# Altium footprint library E-Card.PcbLib: 26 footprints (part 2 of 2)
Each footprint in its own frame and in the unit in brackets; x right, y up, seen from the top. Pads: shape width x height; smd on the part's side, far side on the other; paste and mask are expansions set on the pad; w line width, h text height; cw(c..) or ccw(c..) is an arc to the next point about the centre after c.
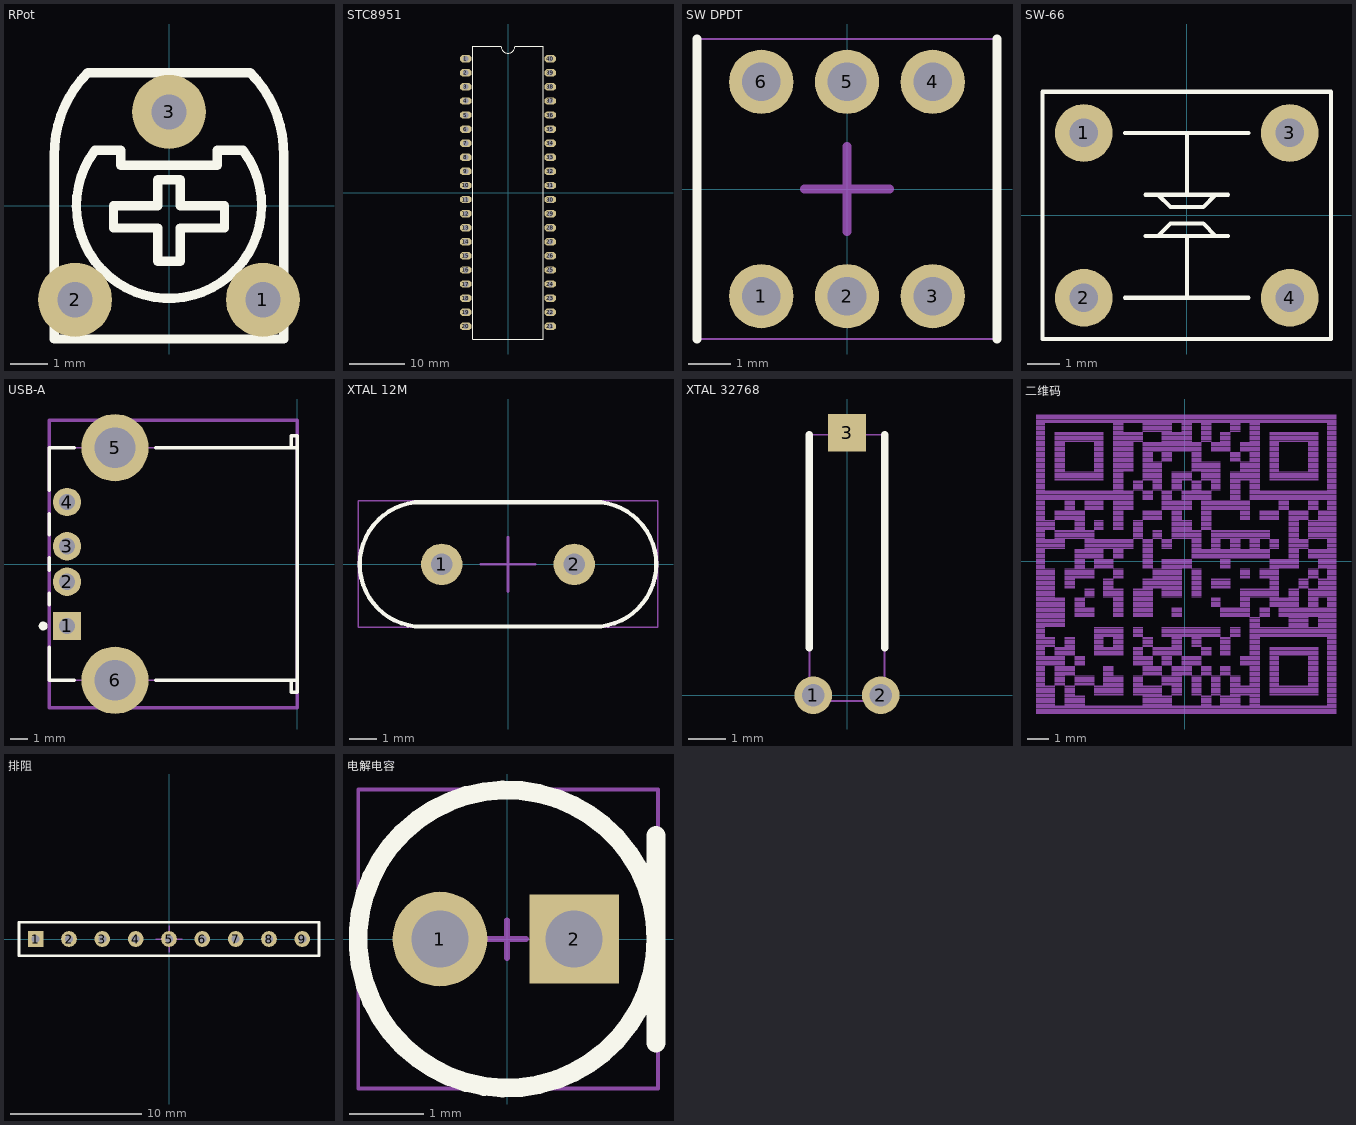
[diagram p1: the footprints below, top view; thin cyan lines are the x and y axes]

## RPot [mm] "可变电阻"
pads (3):
  round 2 hole 0.95: 1(2.54,-2.54) 2(-2.54,-2.54) 3(0,2.54)
Top Overlay:
  lines w0.254: -3.1,1.36 cw(c0,1.41) -2.197,3.597 ; -3.1,1.4 -3.1,-3.6 3.1,-3.6 3.1,1.4 ; -2.2,3.6 2.2,3.6 ; -1.301,1.501 -2.002,1.501 ccw(c0,0) 2.002,1.501 1.301,1.501 1.3,1.5 1.3,1.1 -1.3,1.1 -1.3,1.5 ; 2.197,3.597 cw(c0,1.41) 3.1,1.36 ; -1.5,-0.6 -0.3,-0.6 -0.3,-1.5 0.3,-1.5 0.3,-0.6 1.5,-0.6 1.5,0 0.3,0 0.3,0.7 -0.3,0.7 -0.3,0 -1.5,0 -1.5,-0.6
3D body "RM065.STEP": height 7.6, standoff -3.5, extent -3.25,-4.288 3.25,3.292

## STC8951 [mil]
pads (40):
  oct 80x52 hole 39.37: 1(-300,950) 2(-300,850) 3(-300,750) 4(-300,650) 5(-300,550) 6(-300,450) 7(-300,350) 8(-300,250) 9(-300,150) 10(-300,50) 11(-300,-50) 12(-300,-150) 13(-300,-250) 14(-300,-350) 15(-300,-450) 16(-300,-550) 17(-300,-650) 18(-300,-750) 19(-300,-850) 20(-300,-950) 21(300,-950) 22(300,-850) 23(300,-750) 24(300,-650) 25(300,-550) 26(300,-450) 27(300,-350) 28(300,-250) 29(300,-150) 30(300,-50) 31(300,50) 32(300,150) 33(300,250) 34(300,350) 35(300,450) 36(300,550) 37(300,650) 38(300,750) 39(300,850) 40(300,950)
Top Overlay:
  lines w6: -250,-1040 250,-1040 250,1040 50,1040 cw(c0,1040) -50,1040 -250,1040 -250,-1040
3D body "ZIF-40.STEP": height 146.85, standoff -483.07, extent -489.8,-1194.51 449.8,1844.51
3D body "89C51-DIP40.step": height 696.46, standoff 374.8, extent -305.11,-1035.43 305.12,1035.43

## SW DPDT [mm] "自锁开关"
height 13.5
pads (6):
  round 1.5 hole 0.9: 1(-2,-2.5) 2(0,-2.5) 3(2,-2.5) 4(2,2.5) 5(0,2.5) 6(-2,2.5)
Top Overlay:
  lines w0.2: -3.5,-3.5 -3.5,3.5 ; 3.5,-3.5 3.5,3.5
Mechanical 13:
  lines w0.05: -3.5,-3.5 3.5,-3.5 3.5,3.5 -3.5,3.5 -3.5,-3.5
Mechanical 15:
  lines w0.2: -1,0 1,0 ; 0,-1 0,1
3D body "ps-22e07.stp": height 12.6, standoff -3.5, extent -3.5,-3.5 3.5,3.5

## SW-66 [mil] "6×6轻触开关"
pads (4):
  round 70 hole 34.65: 1(-125,100) 2(-125,-100) 3(125,100) 4(125,-100)
Top Overlay:
  lines w5: -75,-100 75,-100 ; -75,100 75,100 ; -50,-25 50,-25 ; -50,25 50,25 ; -35,-25 -20,-10 20,-10 35,-25 ; -35,25 -20,10 20,10 35,25 ; 0,-100 0,-25 ; 0,25 0,100 ; -175,-150 175,-150 175,150 -175,150 -175,-150
3D body "User Library-Panasonic-EVQPA-Pushbutton.STEP": height 212.6, standoff -118.11, extent -161.65,-118.1 161.65,118.11

## USB-A [mm]
pads (6):
  rect 1.6x1.6 hole 0.92: 1(-12.99,-3.5)
  round 1.6 hole 0.92: 2(-12.99,-1) 3(-12.99,1) 4(-12.99,3.5)
  round 3.8 hole 2.3: 5(-10.28,6.57) 6(-10.28,-6.57)
Top Overlay:
  circle w0.25: c-14.34,-3.5 r0.125
  lines w0.2: -14,-4.7 -14,-6.565 -12.58,-6.565 ; -14,-2.3 -14,-1.66 ; -14,-0.34 -14,0.34 ; -14,1.66 -14,2.84 ; -14,4.16 -14,6.565 -12.58,6.565 ; -7.98,-6.565 0,-6.565 ; -7.98,6.565 0,6.565 ; -0.32,-6.565 -0.32,-7.25 0,-7.25 0,-6.565 ; -0.32,6.565 -0.32,7.25 0,7.25 0,6.565 ; 0,-6.565 0,6.565
Mechanical 13:
  lines w0.1: -14,-6.565 -14,6.565 -0.32,6.565 -0.32,7.25 0,7.25 0,-7.25 -0.32,-7.25 -0.32,-6.565 -14,-6.565
  lines w0.2: -14,-8.117 -14,8.117 0,8.117 0,-8.117 -14,-8.117
3D body "c-292303-3.stp": height 7.67, standoff -3.6, extent -14,-8.117 0,8.117

## XTAL 12M [mil] "XTAL 12M"
pads (2):
  round 60 hole 31.5: 1(-96.06,0) 2(96.06,0)
Top Overlay:
  lines w6: -135,-90 cw(c-124.43,0) -135,90 135,90 cw(c124.43,0) 135,-90 -135,-90
Mechanical 13:
  lines w1.97: -217.52,-91.07 -217.52,92 217.52,92 217.52,-91.07 -217.52,-91.07
Mechanical 15:
  lines w3.94: -39.37,0 39.37,0 ; 0,-39.37 0,39.37
3D body "hc-49s.stp": height 145.87, standoff -153.54, extent -217.52,-91.07 217.52,92

## XTAL 32768 [mm] "32768Hz圆柱形晶振"
height 2
pads (3):
  round 1 hole 0.6: 1(-0.9,0) 2(0.9,0)
  rect 1x1 smd: 3(0,7)
Top Overlay:
  lines w0.2: -1,1.27 -1,6.948 ; 1,1.27 1,6.948
Mechanical 13:
  lines w0.05: -1,-0.152 -1,6.948 1,6.948 1,-0.152 -1,-0.152
3D body "nc26lf.stp": height 2, standoff -3.5, extent -1,-0.152 1,6.948

## 二维码 [mil]
Bottom Overlay:
  drawing of 2312 lines, arcs and shapes, not listed

## 排阻 [mm]
pads (9):
  rect 1.2x1.2 hole 0.6 mask+0.102: 1(-10.16,0)
  round 1.2 hole 0.6 mask+0.102: 2(-7.62,0) 3(-5.08,0) 4(-2.54,0) 5(0,0) 6(2.54,0) 7(5.08,0) 8(7.62,0) 9(10.16,0)
Top Overlay:
  lines w0.2: -11.43,-1.27 11.43,-1.27 11.43,1.27 -11.43,1.27 -11.43,-1.27
Mechanical 13:
  lines w0.05: -11.43,-1.23 11.43,-1.23 11.43,1.27 -11.43,1.27 -11.43,-1.23
Mechanical 15:
  lines w0.1: -1,0 1,0 ; 0,-1 0,1
3D body "User Library-ResistorNetwork9SIP10KOhm.step": height 5.27, standoff -2.73, extent -11.16,-1 11.16,1

## 电解电容 [mm] "电解电容"
pads (2):
  round 1.27 hole 0.762: 1(-0.9,0)
  rect 1.2x1.2 hole 0.762: 2(0.9,0)
Top Overlay:
  circle w0.254: c0,0 r2
  lines w0.254: 2,-1.397 2,1.39
Mechanical 13:
  lines w0.05: -1.998,-2.007 2.025,-2.007 2.025,2.007 -1.998,2.007 -1.998,-2.007
Mechanical 15:
  lines w0.076: -0.254,0 0.254,0 ; 0,-0.254 0,0.254
3D body "cd110-4x7.stp": height 7.11, standoff -3.6, extent -1.998,-2.007 2.025,2.007